# Altium footprint library MyComponents_v2.5.PcbLib: 403 footprints (part 7 of 26)
Each footprint in its own frame and in the unit in brackets; x right, y up, seen from the top. Pads: shape width x height; smd on the part's side, far side on the other; paste and mask are expansions set on the pad; w line width, h text height; cw(c..) or ccw(c..) is an arc to the next point about the centre after c.
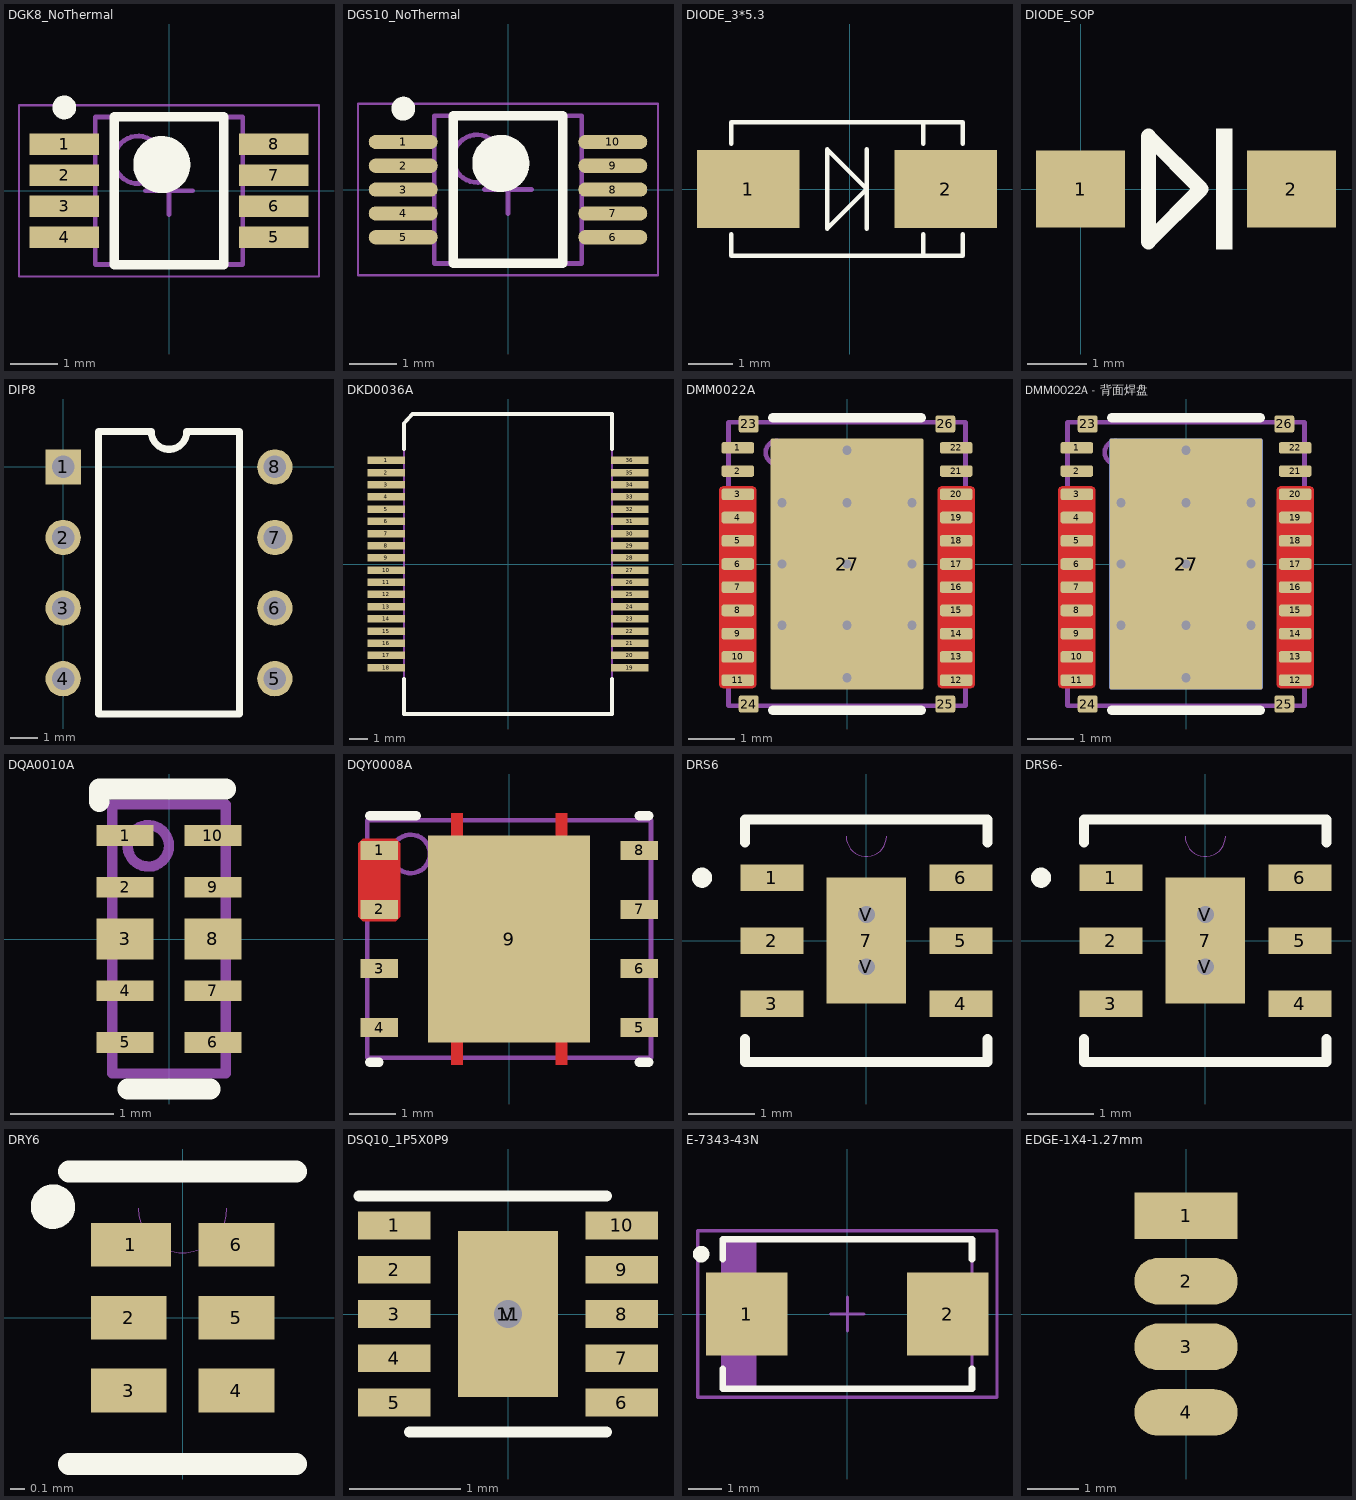
[diagram p6: the footprints below, top view; thin cyan lines are the x and y axes]

## DGK8_NoThermal [mm] "TSOP, 8-Leads, Body 3.00x3.00mm, Pitch 0.65mm, IPC Medium Density"
height 1.1
pads (8):
  rect 1.45x0.45 smd: 1(-2.2,0.975) 2(-2.2,0.325) 3(-2.2,-0.325) 4(-2.2,-0.975) 5(2.2,-0.975) 6(2.2,-0.325) 7(2.2,0.325) 8(2.2,0.975)
Top Overlay:
  circle w0.6: c-0.15,0.55 r0.3
  circle w0.25: c-2.2,1.75 r0.125
  lines w0.2: -1.15,-1.55 1.15,-1.55 1.15,1.55 -1.15,1.55 -1.15,-1.55
Mechanical 13:
  circle w0.1: c-0.65,0.65 r0.5
  lines w0.1: -1.55,-1.55 1.55,-1.55 1.55,1.55 -1.55,1.55 -1.55,-1.55
Mechanical 15:
  lines w0.05: -3.15,-1.8 3.15,-1.8 3.15,1.8 -3.15,1.8 -3.15,-1.8
  lines w0.1: -0.5,0 0.5,0 ; 0,-0.5 0,0.5

## DGS10_NoThermal [mm] "TSSOP, 10-Leads, Body 3.00x3.00mm, Pitch 0.50mm, IPC Medium Density"
height 1.1
pads (10):
  oval 1.45x0.3 smd: 1(-2.2,1) 2(-2.2,0.5) 3(-2.2,0) 4(-2.2,-0.5) 5(-2.2,-1) 6(2.2,-1) 7(2.2,-0.5) 8(2.2,0) 9(2.2,0.5) 10(2.2,1)
Top Overlay:
  circle w0.25: c-2.2,1.7 r0.125
  circle w0.6: c-0.15,0.55 r0.3
  lines w0.2: -1.15,-1.55 -1.15,1.55 1.15,1.55 1.15,-1.55 -1.15,-1.55
Mechanical 13:
  circle w0.1: c-0.65,0.65 r0.5
  lines w0.1: -1.55,-1.55 -1.55,1.55 1.55,1.55 1.55,-1.55 -1.55,-1.55
Mechanical 15:
  lines w0.05: -3.15,-1.8 -3.15,1.8 3.15,1.8 3.15,-1.8 -3.15,-1.8
  lines w0.1: -0.5,0 0.5,0 ; 0,-0.5 0,0.5
3D body: height 1.1, standoff 0.05, extent -1.55,-1.55 1.55,1.55

## DIODE_3*5.3 [mm]
pads (2):
  rect 2.3x1.75 smd: 1(-2.286,0) 2(2.159,0)
Top Overlay:
  lines w0.1: -2.667,-1.016 -2.667,-1.5 2.54,-1.5 2.54,-1.016 ; -2.667,1.016 -2.667,1.5 2.54,1.5 2.54,1.016 ; 0.381,-0.889 0.381,0.889 ; 1.651,-1.5 1.651,-1.016 ; 1.651,1.016 1.651,1.5 ; -0.508,-0.889 -0.508,0.889 0.381,0 -0.508,-0.889

## DIODE_SOP [mm]
pads (2):
  rect 1.5x1.3 smd: 1(0,0) 2(3.556,0)
Top Overlay:
  rectangle: 2.286,-1.016 2.559,1.016
  lines w0.254: 1.143,-0.889 2.032,0 1.143,0.889 1.143,-0.889

## DIP8 [mil]
pads (8):
  rect 50x50 hole 32: 1(0,0)
  round 50 hole 32: 2(0,-100) 3(0,-200) 4(0,-300) 5(300,-300) 6(300,-200) 7(300,-100) 8(300,0)
Top Overlay:
  lines w10: 50,-350 250,-350 250,50 175,50 cw(c150,50) 125,50 50,50 50,-350
3D body "User Library-DIP08-300.STEP": height 188.19, standoff -109.84, extent -4.84,-363.92 305,66

## DKD0036A [mm] "DRV8432"
pads (36):
  rect 2x0.4 smd paste-0.025 mask+0.076: 1(-6.5,5.525) 2(-6.5,4.875) 3(-6.5,4.225) 4(-6.5,3.575) 5(-6.5,2.925) 6(-6.5,2.275) 7(-6.5,1.625) 8(-6.5,0.975) 9(-6.5,0.325) 10(-6.5,-0.325) 11(-6.5,-0.975) 12(-6.5,-1.625) 13(-6.5,-2.275) 14(-6.5,-2.925) 15(-6.5,-3.575) 16(-6.5,-4.225) 17(-6.5,-4.875) 18(-6.5,-5.525) 19(6.5,-5.525) 20(6.5,-4.875) 21(6.5,-4.225) 22(6.5,-3.575) 23(6.5,-2.925) 24(6.5,-2.275) 25(6.5,-1.625) 26(6.5,-0.975) 27(6.5,-0.325) 28(6.5,0.325) 29(6.5,0.975) 30(6.5,1.625) 31(6.5,2.275) 32(6.5,2.925) 33(6.5,3.575) 34(6.5,4.225) 35(6.5,4.875) 36(6.5,5.525)
Top Overlay:
  lines w0.2: -5.55,-6.125 -5.55,-8 5.55,-8 5.55,-6.125 ; -5.55,6.125 -5.55,7.5 -5.1,8 5.55,8 5.55,6.125
Mechanical 13:
  lines w0.1: -5.55,-8 -5.55,7.5 -5.1,8 5.55,8 5.55,-8 -5.55,-8
3D body "User Library-HSSOP36.STEP": height 3.55, standoff -0.05, extent -7.113,-7.95 7.087,7.95

## DMM0022A [mm] "SON, 27-Leads, Body 5x6mm, Pitch 0.5mm"
height 1.05
pads (35):
  rrect40% 0.7x0.25 smd: 1(-2.35,2.5) 2(-2.35,2) 21(2.35,2) 22(2.35,2.5)
  rrect40% 0.7x0.25 smd mask+0: 3(-2.35,1.5) 4(-2.35,1) 5(-2.35,0.5) 6(-2.35,0) 7(-2.35,-0.5) 8(-2.35,-1) 9(-2.35,-1.5) 10(-2.35,-2) 11(-2.35,-2.5) 12(2.35,-2.5) 13(2.35,-2) 14(2.35,-1.5) 15(2.35,-1) 16(2.35,-0.5) 17(2.35,0) 18(2.35,0.5) 19(2.35,1) 20(2.35,1.5)
  rrect27% 0.43x0.375 smd: 23(-2.115,3.013) 24(-2.115,-3.013) 25(2.115,-3.013) 26(2.115,3.013)
  rrect3% 3.3x5.4 smd paste-1.65: 27(0,0)
  rrect50% 1.41x1.12 on Top Paste: ""(-0.805,-1.98) ""(-0.805,-0.66) ""(-0.805,0.66) ""(-0.805,1.98) ""(0.805,-1.98) ""(0.805,-0.66) ""(0.805,0.66) ""(0.805,1.98)
via -1.4,1.32 diameter 0.5 hole 0.2
via -1.4,0 diameter 0.5 hole 0.2
via -1.4,-1.32 diameter 0.5 hole 0.2
via 1.4,-1.32 diameter 0.5 hole 0.2
via 1.4,0 diameter 0.5 hole 0.2
via 1.4,1.32 diameter 0.5 hole 0.2
via 0,-2.45 diameter 0.5 hole 0.2
via 0,2.45 diameter 0.5 hole 0.2
via 0,0 diameter 0.5 hole 0.2
via 0,-1.32 diameter 0.5 hole 0.2
via 0,1.32 diameter 0.5 hole 0.2
Top Layer:
  region: 2.3,1.5 2,1.5 2,-2.5 2.3,-2.5
  rectangle: -2.3,-2.5 -2,1.5
  region: 2.75,-2.575 2.75,1.575 2.75,1.595 2.727,1.652 2.67,1.675 2.65,1.675 2.05,1.675 2.03,1.675 1.973,1.652 1.95,1.595 1.95,1.575 1.95,-2.575 1.95,-2.595 1.973,-2.652 2.03,-2.675 2.05,-2.675 2.65,-2.675 2.67,-2.675 2.727,-2.652 2.75,-2.595
  region: -2.75,-2.575 -2.75,1.575 -2.75,1.595 -2.727,1.652 -2.67,1.675 -2.65,1.675 -2.05,1.675 -2.03,1.675 -1.973,1.652 -1.95,1.595 -1.95,1.575 -1.95,-2.575 -1.95,-2.595 -1.973,-2.652 -2.03,-2.675 -2.05,-2.675 -2.65,-2.675 -2.67,-2.675 -2.727,-2.652 -2.75,-2.595
Top Overlay:
  lines w0.2: -1.6,-3.15 1.6,-3.15 ; -1.6,3.15 1.6,3.15
Mechanical 5:
  circle w0.1: c-1.5,2.4 r0.25
  lines w0.1: -2.55,-3.05 -2.55,3.05 2.55,3.05 2.55,-3.05 -2.55,-3.05
3D body "DMM0022A.stp": height 1.05, standoff 0, extent -2.5,-3 2.5,3

## DMM0022A - 背面焊盘 [mm] "功率级"
pads (36):
  rrect40% 0.7x0.25 smd: 1(-2.35,2.5) 2(-2.35,2) 21(2.35,2) 22(2.35,2.5)
  rrect40% 0.7x0.25 smd mask+0: 3(-2.35,1.5) 4(-2.35,1) 5(-2.35,0.5) 6(-2.35,0) 7(-2.35,-0.5) 8(-2.35,-1) 9(-2.35,-1.5) 10(-2.35,-2) 11(-2.35,-2.5) 12(2.35,-2.5) 13(2.35,-2) 14(2.35,-1.5) 15(2.35,-1) 16(2.35,-0.5) 17(2.35,0) 18(2.35,0.5) 19(2.35,1) 20(2.35,1.5)
  rrect27% 0.43x0.375 smd: 23(-2.115,3.013) 24(-2.115,-3.013) 25(2.115,-3.013) 26(2.115,3.013)
  rrect3% 3.3x5.4 smd paste-1.65: 27(0,0)
  rrect3% 3.3x5.4 smd far side paste-1.65: 27(0,0)
  rrect50% 1.41x1.12 on Top Paste: ""(-0.805,-1.98) ""(-0.805,-0.66) ""(-0.805,0.66) ""(-0.805,1.98) ""(0.805,-1.98) ""(0.805,-0.66) ""(0.805,0.66) ""(0.805,1.98)
via 0,1.32 diameter 0.5 hole 0.2
via 0,-1.32 diameter 0.5 hole 0.2
via 0,0 diameter 0.5 hole 0.2
via 0,2.45 diameter 0.5 hole 0.2
via 0,-2.45 diameter 0.5 hole 0.2
via 1.4,1.32 diameter 0.5 hole 0.2
via 1.4,0 diameter 0.5 hole 0.2
via 1.4,-1.32 diameter 0.5 hole 0.2
via -1.4,-1.32 diameter 0.5 hole 0.2
via -1.4,0 diameter 0.5 hole 0.2
via -1.4,1.32 diameter 0.5 hole 0.2
Top Layer:
  rectangle: -2.3,-2.5 -2,1.5
  region: 2.3,1.5 2,1.5 2,-2.5 2.3,-2.5
  region: -2.75,-2.575 -2.75,1.575 -2.75,1.595 -2.727,1.652 -2.67,1.675 -2.65,1.675 -2.05,1.675 -2.03,1.675 -1.973,1.652 -1.95,1.595 -1.95,1.575 -1.95,-2.575 -1.95,-2.595 -1.973,-2.652 -2.03,-2.675 -2.05,-2.675 -2.65,-2.675 -2.67,-2.675 -2.727,-2.652 -2.75,-2.595
  region: 2.75,-2.575 2.75,1.575 2.75,1.595 2.727,1.652 2.67,1.675 2.65,1.675 2.05,1.675 2.03,1.675 1.973,1.652 1.95,1.595 1.95,1.575 1.95,-2.575 1.95,-2.595 1.973,-2.652 2.03,-2.675 2.05,-2.675 2.65,-2.675 2.67,-2.675 2.727,-2.652 2.75,-2.595
Top Overlay:
  lines w0.2: -1.6,-3.15 1.6,-3.15 ; -1.6,3.15 1.6,3.15
Mechanical 5:
  circle w0.1: c-1.5,2.4 r0.25
  lines w0.1: -2.55,-3.05 2.55,-3.05 2.55,3.05 -2.55,3.05 -2.55,-3.05
3D body "DMM0022A.stp": height 1.05, standoff 0, extent -2.5,-3 2.5,3

## DQA0010A [mm]
pads (10):
  rect 0.55x0.2 smd paste+0 mask+0.051: 1(-0.425,1) 2(-0.425,0.5) 4(-0.425,-0.5) 5(-0.425,-1) 6(0.425,-1) 7(0.425,-0.5) 9(0.425,0.5) 10(0.425,1)
  rect 0.55x0.4 smd paste+0 mask+0.051: 3(-0.425,0) 8(0.425,0)
Top Overlay:
  lines w0.2: -0.675,1.33 -0.675,1.45 -0.55,1.45 0.55,1.45 ; -0.4,-1.45 0.4,-1.45
Mechanical 13:
  circle w0.1: c-0.2,0.9 r0.2
  lines w0.1: -0.55,-1.3 0.55,-1.3 0.55,1.3 -0.55,1.3 -0.55,-1.3
3D body "DQA0010A.stp": height 0.55, standoff 0, extent -0.5,-1.25 0.5,1.25

## DQY0008A [mm]
pads (9):
  rect 0.81x0.41 smd paste+0 mask+0: 1(-2.795,1.905) 2(-2.795,0.635)
  rect 0.81x0.41 smd paste+0 mask+0.051: 3(-2.795,-0.635) 4(-2.795,-1.905) 5(2.795,-1.905) 6(2.795,-0.635) 8(2.795,1.905)
  rect 0.81x0.41 smd paste+0 mask+0.102: 7(2.795,0.635)
  rect 3.48x4.46 smd paste-2.217 mask+0.051: 9(0,0)
Top Layer:
  region: -1.25,-2.7 -1.25,-2.175 -1,-2.175 -1,-2.7
  region: 1.25,-2.7 1.25,-2.175 1,-2.175 1,-2.7
  region: 1.25,2.7 1.25,2.175 1,2.175 1,2.7
  region: -1.25,2.7 -1.25,2.175 -1,2.175 -1,2.7
  region: -3.15,0.38 -3.25,0.48 -3.25,2.06 -3.15,2.16 -2.44,2.16 -2.34,2.06 -2.34,0.48 -2.44,0.38
Top Overlay:
  lines w0.2: -3,-2.65 -2.8,-2.65 ; -3,2.65 -2,2.65 ; 2.8,-2.65 3,-2.65 ; 2.8,2.65 3,2.65
Top Paste:
  region: -1.25,-2.4 -1.25,-2.7 -1,-2.7 -1,-2.4
  region: 1.25,-2.7 1.25,-2.4 1,-2.4 1,-2.7
  region: 1.25,2.4 1.25,2.7 1,2.7 1,2.4
  region: -1.25,2.7 -1.25,2.4 -1,2.4 -1,2.7
  region: 0.1,1.966 0.1,0.1 1.6,0.1 1.6,1.966
  region: -0.1,0.1 -0.1,1.966 -1.6,1.966 -1.6,0.1
  region: -0.1,-1.966 -0.1,-0.1 -1.6,-0.1 -1.6,-1.966
  region: 0.1,-0.1 0.1,-1.966 1.6,-1.966 1.6,-0.1
  region: -2.836,1.905 -2.836,0.635 -2.39,0.635 -2.39,1.905
Top Solder:
  region: -1.301,-2.7 -1.301,-2.175 -1.3,-2.165 -1.297,-2.156 -1.292,-2.147 -1.286,-2.139 -1.278,-2.133 -1.269,-2.128 -1.26,-2.125 -1.25,-2.124 -1,-2.124 -0.99,-2.125 -0.981,-2.128 -0.972,-2.133 -0.964,-2.139 -0.958,-2.147 -0.953,-2.156 -0.95,-2.165 -0.949,-2.175 -0.949,-2.7 -0.95,-2.71 -0.953,-2.719 -0.958,-2.728 -0.964,-2.736 -0.972,-2.742 -0.981,-2.747 -0.99,-2.75 -1,-2.751 -1.25,-2.751 -1.26,-2.75 -1.269,-2.747 -1.278,-2.742 -1.286,-2.736 -1.292,-2.728 -1.297,-2.719 -1.3,-2.71
  region: 1.3,-2.165 1.301,-2.175 1.301,-2.7 1.3,-2.71 1.297,-2.719 1.292,-2.728 1.286,-2.736 1.278,-2.742 1.269,-2.747 1.26,-2.75 1.25,-2.751 1,-2.751 0.99,-2.75 0.981,-2.747 0.972,-2.742 0.964,-2.736 0.958,-2.728 0.953,-2.719 0.95,-2.71 0.949,-2.7 0.949,-2.175 0.95,-2.165 0.953,-2.156 0.958,-2.147 0.964,-2.139 0.972,-2.133 0.981,-2.128 0.99,-2.125 1,-2.124 1.25,-2.124 1.26,-2.125 1.269,-2.128 1.278,-2.133 1.286,-2.139 1.292,-2.147 1.297,-2.156
  region: 1.301,2.7 1.301,2.175 1.3,2.165 1.297,2.156 1.292,2.147 1.286,2.139 1.278,2.133 1.269,2.128 1.26,2.125 1.25,2.124 1,2.124 0.99,2.125 0.981,2.128 0.972,2.133 0.964,2.139 0.958,2.147 0.953,2.156 0.95,2.165 0.949,2.175 0.949,2.7 0.95,2.71 0.953,2.719 0.958,2.728 0.964,2.736 0.972,2.742 0.981,2.747 0.99,2.75 1,2.751 1.25,2.751 1.26,2.75 1.269,2.747 1.278,2.742 1.286,2.736 1.292,2.728 1.297,2.719 1.3,2.71
  region: -1.3,2.165 -1.301,2.175 -1.301,2.7 -1.3,2.71 -1.297,2.719 -1.292,2.728 -1.286,2.736 -1.278,2.742 -1.269,2.747 -1.26,2.75 -1.25,2.751 -1,2.751 -0.99,2.75 -0.981,2.747 -0.972,2.742 -0.964,2.736 -0.958,2.728 -0.953,2.719 -0.95,2.71 -0.949,2.7 -0.949,2.175 -0.95,2.165 -0.953,2.156 -0.958,2.147 -0.964,2.139 -0.972,2.133 -0.981,2.128 -0.99,2.125 -1,2.124 -1.25,2.124 -1.26,2.125 -1.269,2.128 -1.278,2.133 -1.286,2.139 -1.292,2.147 -1.297,2.156
  region: -2.836,1.905 -2.836,0.635 -2.39,0.635 -2.39,1.905
Mechanical 13:
  circle w0.102: c-2.115,1.829 r0.413
  lines w0.1: -3.05,-2.55 -3.05,2.55 3.05,2.55 3.05,-2.55 -3.05,-2.55
3D body "DQY0008A.stp": height 1.6, standoff 0, extent -3,-2.5 3,2.5

## DRS6 [mm]
pads (9):
  rect 0.95x0.4 smd paste-0.2: 1(-1.425,0.95) 2(-1.425,0) 3(-1.425,-0.95) 4(1.425,-0.95) 5(1.425,0) 6(1.425,0.95)
  rect 1.2x1.9 smd paste-0.937 mask-0.94: 7(0,0)
  round 0.508 / inner round 1.524 / far side round 0.508 hole 0.254: V(0,-0.394) V(0,0.394)
Top Layer:
  region: 
  region: 
Top Overlay:
  circle w0.152: c-2.477,0.95 r0.076
  lines w0.152: -1.829,-1.483 -1.829,-1.829 1.829,-1.829 1.829,-1.483 ; -1.829,1.483 -1.829,1.829 1.829,1.829 1.829,1.483
Top Paste:
  region: -0.975,1.125 -1.875,1.125 -1.875,0.775 -0.975,0.775
  region: -0.975,0.175 -1.875,0.175 -1.875,-0.175 -0.975,-0.175
  region: -0.975,-0.775 -1.875,-0.775 -1.875,-1.125 -0.975,-1.125
  region: 1.875,-0.775 0.975,-0.775 0.975,-1.125 1.875,-1.125
  region: 1.875,0.175 0.975,0.175 0.975,-0.175 1.875,-0.175
  region: 1.875,1.125 0.975,1.125 0.975,0.775 1.875,0.775
  region: -0.1,0.875 -0.525,0.875 -0.525,0.494 -0.241,0.494 -0.1,0.635
  region: -0.241,0.294 -0.525,0.294 -0.525,-0.294 -0.241,-0.294 -0.1,-0.152 -0.1,0.152
  region: -0.241,-0.494 -0.525,-0.494 -0.525,-0.875 -0.1,-0.875 -0.1,-0.635
  region: 0.525,0.875 0.1,0.875 0.1,0.635 0.241,0.494 0.525,0.494
  region: 0.525,0.294 0.241,0.294 0.1,0.152 0.1,-0.152 0.241,-0.294 0.525,-0.294
  region: 0.525,-0.494 0.241,-0.494 0.1,-0.635 0.1,-0.875 0.525,-0.875
Top Solder:
  region: -0.88,1.22 -1.97,1.22 -1.97,0.68 -0.88,0.68
  region: -0.88,0.27 -1.97,0.27 -1.97,-0.27 -0.88,-0.27
  region: -0.88,-0.68 -1.97,-0.68 -1.97,-1.22 -0.88,-1.22
  region: 1.97,-0.68 0.88,-0.68 0.88,-1.22 1.97,-1.22
  region: 1.97,0.27 0.88,0.27 0.88,-0.27 1.97,-0.27
  region: 1.97,1.22 0.88,1.22 0.88,0.68 1.97,0.68
  region: -0.663,0.594 -0.663,1.014 0.663,1.014 0.663,0.594
  region: -0.663,-0.194 -0.663,0.194 0.663,0.194 0.663,-0.194
  region: -0.663,-1.014 -0.663,-0.594 0.663,-0.594 0.663,-1.014
  region: -0.663,-1.014 -0.663,1.014 -0.2,1.014 -0.2,-1.014
  region: 0.2,-1.014 0.2,1.014 0.663,1.014 0.663,-1.014
  region: 
  region: 
Mechanical 13:
  circle w0: c-2.477,0.95 r0.076
  lines w0: -0.305,1.575 ccw(c0,1.575) 0.305,1.575
3D body "DRS6_1P9X1P2.stp": height 0.95, standoff 0, extent -1.626,-1.575 1.626,1.575

## DRS6- [mm]
pads (9):
  rect 0.95x0.4 smd paste-0.2: 1(-1.425,0.95) 2(-1.425,0) 3(-1.425,-0.95) 4(1.425,-0.95) 5(1.425,0) 6(1.425,0.95)
  rect 1.2x1.9 smd paste-0.937 mask-0.94: 7(0,0)
  round 0.508 / inner round 1.524 / far side round 0.508 hole 0.254: V(0,-0.394) V(0,0.394)
Top Layer:
  region: 0,0.95
  region: 0,-0.95
Top Overlay:
  circle w0.152: c-2.477,0.95 r0.076
  lines w0.152: -1.829,-1.483 -1.829,-1.829 1.829,-1.829 1.829,-1.483 ; -1.829,1.483 -1.829,1.829 1.829,1.829 1.829,1.483
Top Paste:
  region: -0.975,1.125 -1.875,1.125 -1.875,0.775 -0.975,0.775
  region: -0.975,0.175 -1.875,0.175 -1.875,-0.175 -0.975,-0.175
  region: -0.975,-0.775 -1.875,-0.775 -1.875,-1.125 -0.975,-1.125
  region: 1.875,-0.775 0.975,-0.775 0.975,-1.125 1.875,-1.125
  region: 1.875,0.175 0.975,0.175 0.975,-0.175 1.875,-0.175
  region: 1.875,1.125 0.975,1.125 0.975,0.775 1.875,0.775
  region: -0.1,0.875 -0.525,0.875 -0.525,0.494 -0.241,0.494 -0.1,0.635
  region: -0.241,0.294 -0.525,0.294 -0.525,-0.294 -0.241,-0.294 -0.1,-0.152 -0.1,0.152
  region: -0.241,-0.494 -0.525,-0.494 -0.525,-0.875 -0.1,-0.875 -0.1,-0.635
  region: 0.525,0.875 0.1,0.875 0.1,0.635 0.241,0.494 0.525,0.494
  region: 0.525,0.294 0.241,0.294 0.1,0.152 0.1,-0.152 0.241,-0.294 0.525,-0.294
  region: 0.525,-0.494 0.241,-0.494 0.1,-0.635 0.1,-0.875 0.525,-0.875
Top Solder:
  region: -0.88,1.22 -1.97,1.22 -1.97,0.68 -0.88,0.68
  region: -0.88,0.27 -1.97,0.27 -1.97,-0.27 -0.88,-0.27
  region: -0.88,-0.68 -1.97,-0.68 -1.97,-1.22 -0.88,-1.22
  region: 1.97,-0.68 0.88,-0.68 0.88,-1.22 1.97,-1.22
  region: 1.97,0.27 0.88,0.27 0.88,-0.27 1.97,-0.27
  region: 1.97,1.22 0.88,1.22 0.88,0.68 1.97,0.68
  region: -0.663,0.594 -0.663,1.014 0.663,1.014 0.663,0.594
  region: -0.663,-0.194 -0.663,0.194 0.663,0.194 0.663,-0.194
  region: -0.663,-1.014 -0.663,-0.594 0.663,-0.594 0.663,-1.014
  region: -0.663,-1.014 -0.663,1.014 -0.2,1.014 -0.2,-1.014
  region: 0.2,-1.014 0.2,1.014 0.663,1.014 0.663,-1.014
  region: 0,0.95
  region: 0,-0.95
Mechanical 13:
  circle w0: c-2.477,0.95 r0.076
  lines w0: -0.305,1.575 ccw(c0,1.575) 0.305,1.575
3D body "DRS6_1P9X1P2.stp": height 0.95, standoff 0, extent -1.626,-1.575 1.626,1.575

## DRY6 [mm]
pads (6):
  rect 0.55x0.3 smd paste-0.15: 1(-0.355,0.5)
  rect 0.52x0.3 smd paste-0.15: 2(-0.37,0) 3(-0.37,-0.5) 4(0.37,-0.5) 5(0.37,0) 6(0.37,0.5)
Top Overlay:
  circle w0.152: c-0.889,0.762 r0.076
  lines w0.152: -0.779,-1.004 0.779,-1.004 ; -0.779,1.004 0.779,1.004
Top Paste:
  region: 0.605,0.625 0.135,0.625 0.135,0.375 0.605,0.375
  region: 0.605,0.125 0.135,0.125 0.135,-0.125 0.605,-0.125
  region: 0.605,-0.375 0.135,-0.375 0.135,-0.625 0.605,-0.625
  region: -0.135,-0.375 -0.605,-0.375 -0.605,-0.625 -0.135,-0.625
  region: -0.135,0.125 -0.605,0.125 -0.605,-0.125 -0.135,-0.125
  region: -0.105,0.625 -0.605,0.625 -0.605,0.375 -0.105,0.375
Top Solder:
  region: 0.7,0.72 0.04,0.72 0.04,0.28 0.7,0.28
  region: 0.7,0.22 0.04,0.22 0.04,-0.22 0.7,-0.22
  region: 0.7,-0.28 0.04,-0.28 0.04,-0.72 0.7,-0.72
  region: -0.04,-0.28 -0.7,-0.28 -0.7,-0.72 -0.04,-0.72
  region: -0.04,0.22 -0.7,0.22 -0.7,-0.22 -0.04,-0.22
  region: -0.04,0.72 -0.7,0.72 -0.7,0.28 -0.04,0.28
Mechanical 13:
  lines w0: -0.305,0.75 ccw(c0,0.75) 0.305,0.75

## DSQ10_1P5X0P9 [mm]
pads (12):
  rect 0.655x0.25 smd: 1(-1.027,0.8) 2(-1.027,0.4) 3(-1.027,0) 4(-1.027,-0.4) 5(-1.027,-0.8) 6(1.027,-0.8) 7(1.027,-0.4) 8(1.027,0) 9(1.027,0.4) 10(1.027,0.8)
  rect 0.9x1.5 smd paste-0.737: 11(0,0)
  rect 0.508x0.508 / inner round 1.524 / far side rect 0.508x0.508 hole 0.254: V(0,0)
Top Overlay:
  lines w0.1: -1.346,1.067 0.889,1.067 ; -0.889,-1.067 0.889,-1.067
Top Paste:
  region: 0.375,-0.1 0.241,-0.1 0.1,-0.241 0.1,-0.675 0.375,-0.675
  region: 0.375,0.675 0.1,0.675 0.1,0.241 0.241,0.1 0.375,0.1
  region: -0.241,-0.1 -0.375,-0.1 -0.375,-0.675 -0.1,-0.675 -0.1,-0.241
  region: -0.1,0.675 -0.375,0.675 -0.375,0.1 -0.241,0.1 -0.1,0.241
Top Solder:
  region: 0.2,-0.814 0.2,0.814 0.513,0.814 0.513,-0.814
  region: -0.513,-0.814 -0.513,0.814 -0.2,0.814 -0.2,-0.814
  region: -0.513,-0.814 -0.513,-0.2 0.513,-0.2 0.513,-0.814
  region: -0.513,0.2 -0.513,0.814 0.513,0.814 0.513,0.2
3D body: height 0.8, standoff 0, extent -1.101,-1.05 1.101,1.05

## E-7343-43N [mm] "E型钽电容"
height 4.3
pads (2):
  rect 2.45x2.5 smd: 1(-3.025,0) 2(3.025,0)
Top Overlay:
  circle w0.25: c-4.4,1.8 r0.125
  lines w0.2: -3.75,-1.65 -3.75,-2.25 3.75,-2.25 3.75,-1.65 ; -3.75,1.65 -3.75,2.25 3.75,2.25 3.75,1.65
Mechanical 13:
  rectangle: -3.75,-2.25 -2.741,2.25
  lines w0.1: -3.75,-2.25 -3.75,2.25 3.75,2.25 3.75,-2.25 -3.75,-2.25
Mechanical 15:
  lines w0.1: -0.5,0 0.5,0 ; 0,-0.5 0,0.5 ; -4.5,-2.5 -4.5,2.5 4.5,2.5 4.5,-2.5 -4.5,-2.5
3D body: height 4.3, standoff 0, extent -3.75,-2.25 3.75,2.25

## EDGE-1X4-1.27mm [mm] "1X4引脚 间距1.27mm 金手指"
pads (4):
  rect 2x0.9 smd: 1(0,1.905)
  oval 2x0.9 smd: 2(0,0.635) 3(0,-0.635) 4(0,-1.905)